# Altium footprint library hphonglib.PcbLib: 703 footprints (part 7 of 44)
Each footprint in its own frame and in the unit in brackets; x right, y up, seen from the top. Pads: shape width x height; smd on the part's side, far side on the other; paste and mask are expansions set on the pad; w line width, h text height; cw(c..) or ccw(c..) is an arc to the next point about the centre after c.
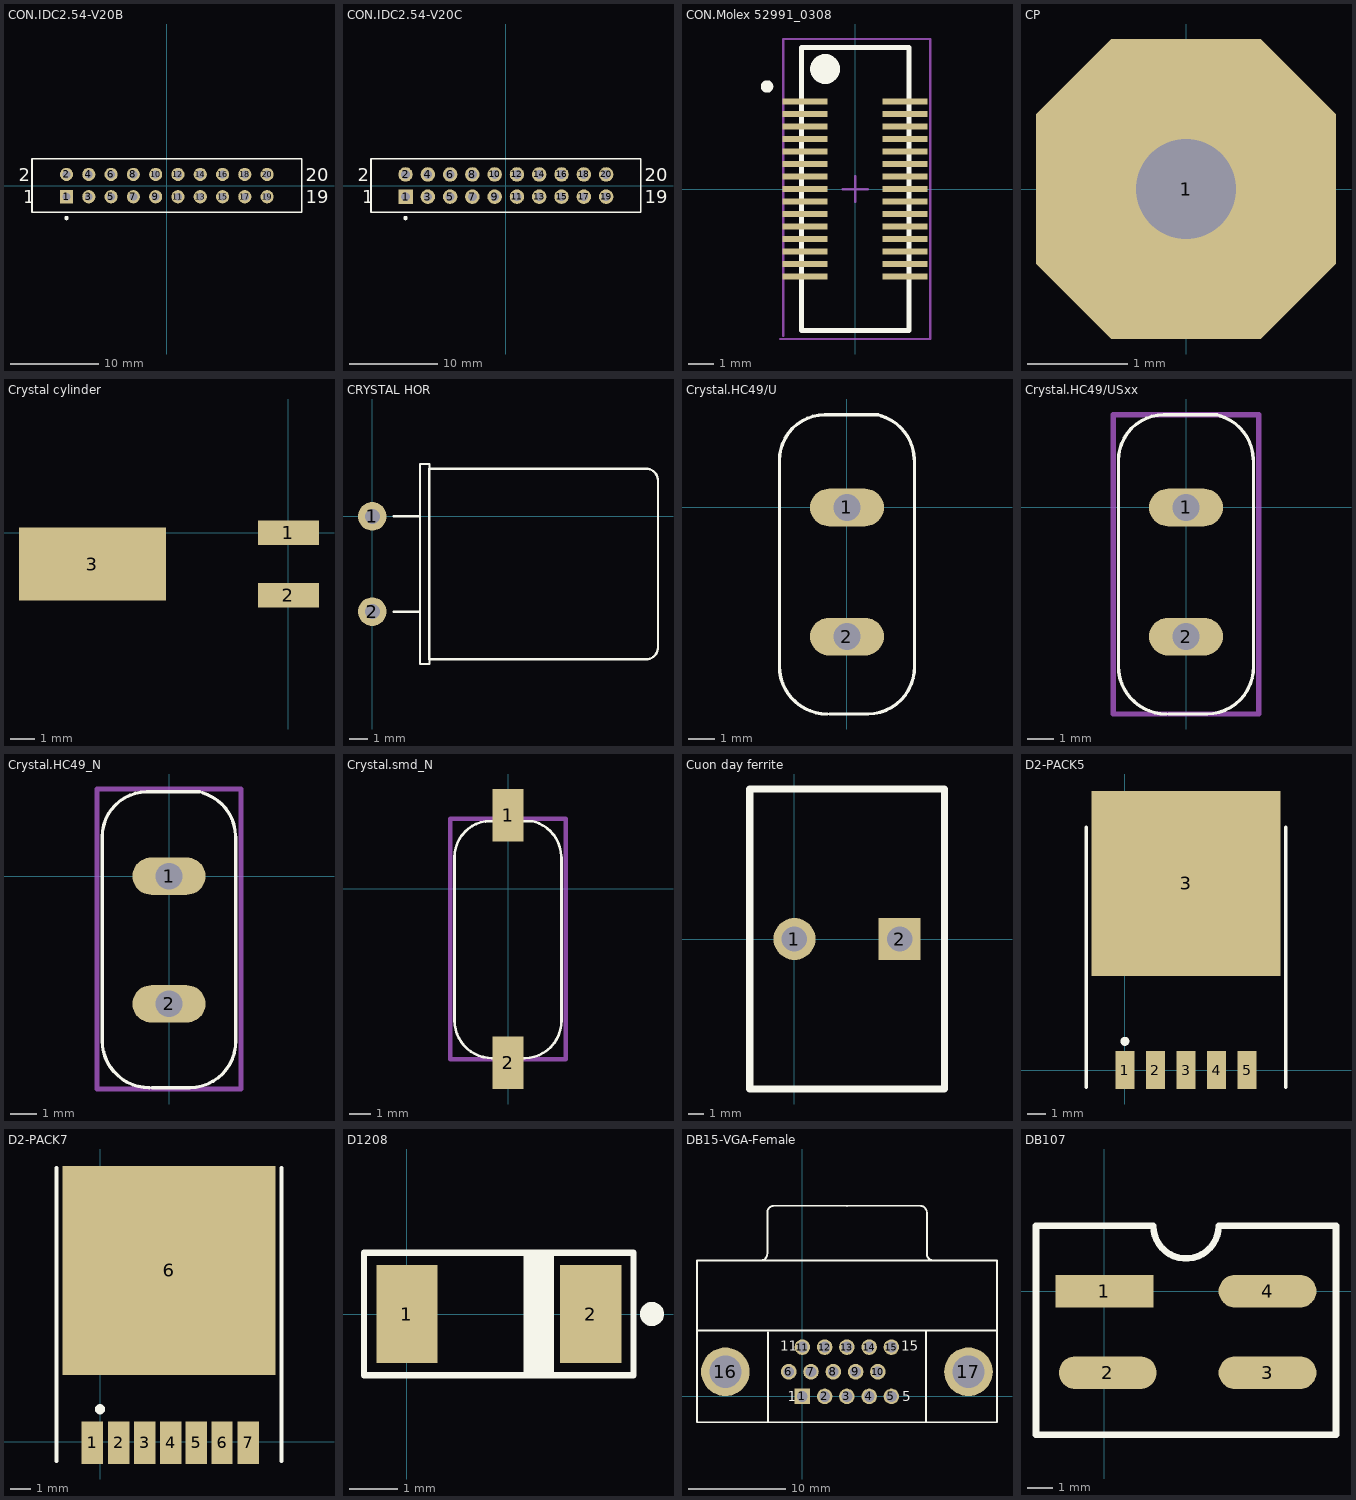
[diagram p6: the footprints below, top view; thin cyan lines are the x and y axes]

## CON.IDC2.54-V20B [mm] "Connector; IDC, PCB Transition - 2 Rows, Thru-Hole; 20 Position; Vertical; Pitch 2.54 mm; Body 30.74 x 6.1 x 7.45 mm (LxWxH)"
height 7.45
pads (20):
  rect 1.5x1.5 hole 0.9: 1(-11.43,-1.27)
  round 1.5 hole 0.9: 2(-11.43,1.27) 3(-8.89,-1.27) 4(-8.89,1.27) 5(-6.35,-1.27) 6(-6.35,1.27) 7(-3.81,-1.27) 8(-3.81,1.27) 9(-1.27,-1.27) 10(-1.27,1.27) 11(1.27,-1.27) 12(1.27,1.27) 13(3.81,-1.27) 14(3.81,1.27) 15(6.35,-1.27) 16(6.35,1.27) 17(8.89,-1.27) 18(8.89,1.27) 19(11.43,-1.27) 20(11.43,1.27)
Top Overlay:
  circle w0.25: c-11.43,-3.7 r0.125
  lines w0.2: -15.37,-3.05 15.37,-3.05 15.37,3.05 -15.37,3.05 -15.37,-3.05
  text "19" at 15.845,-2.02 h1.5
  text "20" at 15.845,0.52 h1.5
  text "1" at -16.345,-2.02 h1.5
  text "2" at -16.845,0.52 h1.5

## CON.IDC2.54-V20C [mm] "Connector; IDC, PCB Transition - 2 Rows, Thru-Hole; 20 Position; Vertical; Pitch 2.54 mm; Body 30.74 x 6.1 x 7.45 mm (LxWxH), Kinked Contacts"
height 7.45
pads (20):
  rect 1.65x1.65 hole 1: 1(-11.43,-1.27)
  round 1.65 hole 1: 2(-11.43,1.27) 3(-8.89,-1.27) 4(-8.89,1.27) 5(-6.35,-1.27) 6(-6.35,1.27) 7(-3.81,-1.27) 8(-3.81,1.27) 9(-1.27,-1.27) 10(-1.27,1.27) 11(1.27,-1.27) 12(1.27,1.27) 13(3.81,-1.27) 14(3.81,1.27) 15(6.35,-1.27) 16(6.35,1.27) 17(8.89,-1.27) 18(8.89,1.27) 19(11.43,-1.27) 20(11.43,1.27)
Top Overlay:
  circle w0.25: c-11.43,-3.7 r0.125
  lines w0.2: -15.37,-3.05 15.37,-3.05 15.37,3.05 -15.37,3.05 -15.37,-3.05
  text "19" at 15.845,-2.02 h1.5
  text "20" at 15.845,0.52 h1.5
  text "1" at -16.345,-2.02 h1.5
  text "2" at -16.845,0.52 h1.5

## CON.Molex 52991_0308 [mm] "0.50mm (.020\") Pitch SlimStack(TM) Receptacle, Surface Mount, Dual Row, Vertical"
height 2.65
pads (30):
  rect 1.8x0.25 smd: 1(-2,3.5) 2(-2,3) 3(-2,2.5) 4(-2,2) 5(-2,1.5) 6(-2,1) 7(-2,0.5) 8(-2,0) 9(-2,-0.5) 10(-2,-1) 11(-2,-1.5) 12(-2,-2) 13(-2,-2.5) 14(-2,-3) 15(-2,-3.5) 16(2,-3.5) 17(2,-3) 18(2,-2.5) 19(2,-2) 20(2,-1.5) 21(2,-1) 22(2,-0.5) 23(2,0) 24(2,0.5) 25(2,1) 26(2,1.5) 27(2,2) 28(2,2.5) 29(2,3) 30(2,3.5)
Top Overlay:
  circle w0.25: c-3.525,4.1 r0.125
  circle w0.6: c-1.2,4.8 r0.3
  lines w0.2: -2.15,-5.65 -2.15,5.65 2.15,5.65 2.15,-5.65 -2.15,-5.65
Mechanical 15:
  lines w0.1: -3,-6 3,-6 3,6 -2.875,6 -2.873,-5.873 ; -0.5,0 0.5,0 ; 0,-0.5 0,0.5
3D body: height 0.1, standoff 0.01, extent 2.013,-0.1 2.625,0.1
3D body: height 0.1, standoff 0.01, extent 2,0.4 2.612,0.6
3D body: height 0.1, standoff 0.01, extent 2,3.4 2.612,3.6
3D body: height 0.1, standoff 0.01, extent 2,2.9 2.612,3.1
3D body: height 0.1, standoff 0.01, extent 2,2.4 2.612,2.6
3D body: height 0.1, standoff 0.01, extent 2,1.9 2.612,2.1
3D body: height 0.1, standoff 0.01, extent 2,1.4 2.612,1.6
3D body: height 0.1, standoff 0.01, extent 2,0.9 2.612,1.1
3D body: height 0.1, standoff 0.01, extent 2,-0.6 2.612,-0.4
3D body: height 0.1, standoff 0.01, extent 2,-1.1 2.612,-0.9
3D body: height 0.1, standoff 0.01, extent 2,-1.6 2.612,-1.4
3D body: height 0.1, standoff 0.01, extent 2,-2.1 2.612,-1.9
3D body: height 0.1, standoff 0.01, extent 2,-2.6 2.612,-2.4
3D body: height 0.1, standoff 0.01, extent 2,-3.1 2.612,-2.9
3D body: height 0.1, standoff 0.01, extent 2,-3.6 2.612,-3.4
3D body: height 0.1, standoff 0.01, extent -2.6,-0.1 -1.988,0.1
3D body: height 0.1, standoff 0.01, extent -2.612,-3.6 -2,-3.4
3D body: height 0.1, standoff 0.01, extent -2.612,-3.1 -2,-2.9
3D body: height 0.1, standoff 0.01, extent -2.612,-2.6 -2,-2.4
3D body: height 0.1, standoff 0.01, extent -2.612,-2.1 -2,-1.9
3D body: height 0.1, standoff 0.01, extent -2.612,-1.6 -2,-1.4
3D body: height 0.1, standoff 0.01, extent -2.612,-1.1 -2,-0.9
3D body: height 0.1, standoff 0.01, extent -2.612,-0.6 -2,-0.4
3D body: height 0.1, standoff 0.01, extent -2.612,0.4 -2,0.6
3D body: height 0.1, standoff 0.01, extent -2.612,0.9 -2,1.1
3D body: height 0.1, standoff 0.01, extent -2.612,1.4 -2,1.6
3D body: height 0.1, standoff 0.01, extent -2.612,1.9 -2,2.1
3D body: height 0.1, standoff 0.01, extent -2.612,2.4 -2,2.6
3D body: height 0.1, standoff 0.01, extent -2.612,2.9 -2,3.1
3D body: height 0.1, standoff 0.01, extent -2.612,3.4 -2,3.6
3D body: height 1.8, standoff 1.2, extent 0.9,3.4 1.025,3.6
3D body: height 1.8, standoff 1.2, extent 0.9,2.9 1.025,3.1
3D body: height 1.8, standoff 1.2, extent 0.9,2.4 1.025,2.6
3D body: height 1.8, standoff 1.2, extent 0.9,1.9 1.025,2.1
3D body: height 1.8, standoff 1.2, extent 0.9,1.4 1.025,1.6
3D body: height 1.8, standoff 1.2, extent 0.9,0.9 1.025,1.1
3D body: height 1.8, standoff 1.2, extent 0.9,0.4 1.025,0.6
3D body: height 1.8, standoff 1.2, extent 0.9,-0.1 1.025,0.1
3D body: height 1.8, standoff 1.2, extent 0.9,-0.6 1.025,-0.4
3D body: height 1.8, standoff 1.2, extent 0.9,-1.1 1.025,-0.9
3D body: height 1.8, standoff 1.2, extent 0.9,-1.6 1.025,-1.4
3D body: height 1.8, standoff 1.2, extent 0.9,-2.1 1.025,-1.9
3D body: height 1.8, standoff 1.2, extent 0.9,-2.6 1.025,-2.4
3D body: height 1.8, standoff 1.2, extent 0.9,-3.1 1.025,-2.9
3D body: height 1.8, standoff 1.2, extent 0.9,-3.6 1.025,-3.4
3D body: height 1.8, standoff 1.2, extent -1.025,-3.6 -0.9,-3.4
3D body: height 1.8, standoff 1.2, extent -1.025,-3.1 -0.9,-2.9
3D body: height 1.8, standoff 1.2, extent -1.025,-2.6 -0.9,-2.4
3D body: height 1.8, standoff 1.2, extent -1.025,-2.1 -0.9,-1.9
3D body: height 1.8, standoff 1.2, extent -1.025,-1.6 -0.9,-1.4
3D body: height 1.8, standoff 1.2, extent -1.025,-1.1 -0.9,-0.9
3D body: height 1.8, standoff 1.2, extent -1.025,-0.6 -0.9,-0.4
3D body: height 1.8, standoff 1.2, extent -1.025,-0.1 -0.9,0.1
3D body: height 1.8, standoff 1.2, extent -1.025,0.4 -0.9,0.6
3D body: height 1.8, standoff 1.2, extent -1.025,0.9 -0.9,1.1
3D body: height 1.8, standoff 1.2, extent -1.025,1.4 -0.9,1.6
3D body: height 1.8, standoff 1.2, extent -1.025,1.9 -0.9,2.1
3D body: height 1.8, standoff 1.2, extent -1.025,2.4 -0.9,2.6
3D body: height 1.8, standoff 1.2, extent -1.025,2.9 -0.9,3.1
3D body: height 1.8, standoff 1.2, extent -1.025,3.4 -0.9,3.6
3D body: height 2.27, standoff 1, extent -1.925,-4.837 0,4.812
3D body: height 2.27, standoff 1, extent 0,-4.834 1.925,4.816
3D body: height 2.27, standoff 1, extent -0.9,-3.85 0.9,3.85
3D body: height 0.8, standoff 0, extent -3.006,-6.011 3.006,6.006

## CP [mm] "Connect Pad, 1-Pin"
pads (1):
  oct 3x3 hole 1: 1(0,0)

## Crystal cylinder [mm] "Crystal footsprint type 1"
height 5.08
pads (3):
  rect 2.5x1 smd: 1(0,0) 2(0,-2.54)
  rect 6x3 smd: 3(-8,-1.27)
3D body: height 1, standoff 0, extent -1.625,-0.225 -1.326,0.075
3D body: height 0.25, standoff -0.05, extent -1.5,-2.6 0.5,-2.301
3D body: height 0.25, standoff -0.05, extent -1.475,-0.225 0.525,0.074
3D body: height 1.05, standoff 0.75, extent -1.625,-2.475 -1.326,-1.675
3D body: height 1.05, standoff 0.75, extent -1.625,-0.85 -1.326,-0.05
3D body: height 1.05, standoff 0.75, extent -2.325,-1.824 -1.325,-1.525
3D body: height 2.29, standoff -0.3, extent -10.025,-2.547 -2.025,0.047
3D body: height 1.05, standoff 0.75, extent -2.325,-1 -1.325,-0.701
3D body: height 1, standoff 0, extent -1.625,-2.6 -1.326,-2.3

## CRYSTAL HOR [mil]
pads (2):
  round 60 hole 31.49 unplated: 1(0,0) 2(0,-200)
Top Overlay:
  lines w3.94: 120,-300 120,-310 100,-310 100,110 120,110 120,100
  lines w5: 45,-200 100,-200 ; 45,0 100,0 ; 120,-300 575,-300 ccw(c575,-275) 600,-275 600,75 ccw(c575,75) 575,100 120,100 120,-300

## Crystal.HC49/U [mil] "HC49U package"
height 200
pads (2):
  rrect100% 110x56 hole 40: 1(0,0) 2(0,-192)
Top Overlay:
  lines w5: -100.39,69.88 cw(c-32.97,70.37) -33.46,137.8 46.26,137.8 ; -100.39,70.21 -100.39,-236.22 ccw(c-29.53,-236.22) -29.53,-307.09 ; -25.59,-307.09 31.5,-307.09 ccw(c30.51,-237.2) 100.39,-236.22 100.39,70.36 ; 50.38,136.26 cw(c31.28,70.36) 99.87,71.55
3D body: height 530, standoff 7.87, extent -72.34,-281 73.3,110.63
3D body: height 31.5, standoff 5, extent -90.2,-297.85 90.49,127.81
3D body: height 200, standoff 0, extent -10.2,-202.39 10.2,-182
3D body: height 200, standoff 0, extent -10.2,-10.39 10.2,10

## Crystal.HC49/USxx [mil] "HC49USxx package"
height 200
pads (2):
  rrect100% 110x56 hole 40: 1(0,0) 2(0,-192)
Top Overlay:
  lines w5: -100.39,69.88 cw(c-32.97,70.37) -33.46,137.8 46.26,137.8 ; -100.39,70.21 -100.39,-236.22 ccw(c-29.53,-236.22) -29.53,-307.09 ; -25.59,-307.09 31.5,-307.09 ccw(c30.51,-237.2) 100.39,-236.22 100.39,70.36 ; 50.38,136.26 cw(c31.28,70.36) 99.87,71.55
Mechanical 13:
  lines w7.87: -108.27,-307.09 -108.27,137.8 108.27,137.8 108.27,-307.09 -108.27,-307.09
3D body: height 200, standoff 0, extent -10.2,-10.39 10.2,10
3D body: height 200, standoff 0, extent -10.2,-202.39 10.2,-182
3D body: height 31.5, standoff 5, extent -90.2,-297.85 90.49,127.81
3D body: height 140, standoff 7.87, extent -72.34,-281 73.3,110.63

## Crystal.HC49_N [mil] "HC49USxx package"
height 200
pads (2):
  rrect100% 110x56 hole 40: 1(0,0) 2(0,-192)
Top Overlay:
  lines w5: -100.39,58.88 cw(c-32.97,59.37) -33.46,126.8 46.26,126.8 ; -100.39,59.21 -100.39,-247.22 ccw(c-29.53,-247.22) -29.53,-318.09 ; -25.59,-318.09 31.5,-318.09 ccw(c30.51,-248.2) 100.39,-247.22 100.39,59.36 ; 50.38,125.26 cw(c31.28,59.36) 99.87,60.55
Mechanical 13:
  lines w7.87: -108.27,-320 -108.27,131 108.27,131 108.27,-320 -108.27,-320
3D body: height 157.48, standoff -137.8, extent -90,-319.43 93.07,127.43

## Crystal.smd_N [mm] "HC49USxx package"
height 5.08
pads (2):
  rect 1.5x2.5 smd: 1(0,3.5) 2(0,-8.3)
Top Overlay:
  lines w0.127: -2.55,1.496 cw(c-0.838,1.508) -0.85,3.221 1.175,3.221 ; -2.55,1.504 -2.55,-6.279 ccw(c-0.75,-6.279) -0.75,-8.079 ; -0.762,-8.079 0.8,-8.079 ccw(c0.775,-6.304) 2.55,-6.279 2.55,1.508 ; 1.28,3.181 cw(c0.795,1.508) 2.537,1.538
Mechanical 13:
  lines w0.2: -2.75,-8.128 -2.75,3.327 2.75,3.327 2.75,-8.128 -2.75,-8.128
3D body: height 4, standoff -3.5, extent -2.286,-8.113 2.364,3.237

## Cuon day ferrite [mm]
height 5.6
pads (2):
  round 2.8 hole 1.7: 1(0,0)
  rect 2.8x2.8 hole 1.7: 2(7,0)
Top Overlay:
  lines w0.5: -3,-10 10,-10 10,10 -3,10 -3,-10

## D2-PACK5 [mm] "D2-PAK; 5 Leads; Body 14.4 (inc. leads) x 10.4 mm (LxW max)"
height 4.65
pads (6):
  rect 1.05x2.1 smd: 1(0,0) 2(1.7,0) 3(3.4,0) 4(5.1,0) 5(6.8,0)
  rect 10.5x10.3 smd: 3(3.404,10.389)
Top Overlay:
  circle w0.25: c0,1.6 r0.125
  lines w0.2: -2.15,-0.95 -2.15,13.5 ; 8.95,-0.95 8.95,13.5
3D body: height 5.18, standoff 0.38, extent -1.596,-0.381 8.404,15.289

## D2-PACK7 [mm] "D2-PAK;"
height 4.65
pads (8):
  rect 1.05x2.1 smd: 1(-0.381,-0.051) 2(0.914,-0.051) 3(2.21,-0.051) 4(3.48,-0.051) 5(4.75,-0.051) 6(6.02,-0.051) 7(7.315,-0.051)
  rect 10.5x10.3 smd: 6(3.4,8.45)
Top Overlay:
  circle w0.25: c0,1.6 r0.125
  lines w0.2: -2.15,-0.95 -2.15,13.5 ; 8.95,-0.95 8.95,13.5
3D body: height 5, standoff 0.43, extent -1.626,-0.808 8.534,13.558

## D1208 [mil]
pads (2):
  rect 50x80 smd: 1(0,0) 2(150,0)
Top Overlay:
  circle w9.84: c200.08,0 r4.92
  rectangle: 95,-50 120,50
  lines w5: -35,-50 -35,50 185,50 185,-50 -35,-50

## DB15-VGA-Female [mm] "7915 Series DSUB Right Angle VGA Female connector; Body Width, 30.81mm, 15 Positions"
pads (17):
  rect 1.6x1.6 hole 1.1: 1(0,0)
  round 1.6 hole 1.1: 2(2.29,0) 3(4.58,0) 4(6.87,0) 5(9.16,0) 6(-1.4,2.54) 7(0.89,2.54) 8(3.18,2.54) 9(5.47,2.54) 10(7.76,2.54) 11(0,5.08) 12(2.29,5.08) 13(4.58,5.08) 14(6.87,5.08) 15(9.16,5.08)
  round 5 hole 3.3: 16(-7.915,2.54) 17(17.075,2.54)
Top Overlay:
  lines w0.2: -10.83,6.77 20.01,6.77 ; -4.3,13.975 ccw(c-4.3,14.67) -3.605,14.67 -3.605,18.91 cw(c-2.91,18.91) -2.91,19.605 4.595,19.59 12.1,19.605 cw(c12.1,18.91) 12.795,18.91 12.795,14.67 ccw(c13.49,14.67) 13.49,13.975 ; -3.535,-2.65 -3.535,6.57 ; 12.725,-2.65 12.725,6.65 ; -10.83,-2.65 20.01,-2.65 20.01,13.97 -10.83,13.97 -10.83,-2.65
  text "1" at -1.524,-0.508 h1
  text "15" at 10.16,4.699 h1
  text "5" at 10.287,-0.508 h1
  text "11" at -2.286,4.699 h1

## DB107 [mil]
pads (4):
  rect 150x50 smd: 1(0,0)
  oval 150x50 smd: 2(5,-125) 3(250,-125) 4(250,0)
Top Overlay:
  lines w10: -105,-220 355,-220 355,100 175,100 cw(c125,100) 75,100 -105,100 -105,-220